# Altium footprint library 学习.PcbLib: 96 footprints (part 1 of 6)
Each footprint in its own frame and in the unit in brackets; x right, y up, seen from the top. Pads: shape width x height; smd on the part's side, far side on the other; paste and mask are expansions set on the pad; w line width, h text height; cw(c..) or ccw(c..) is an arc to the next point about the centre after c.
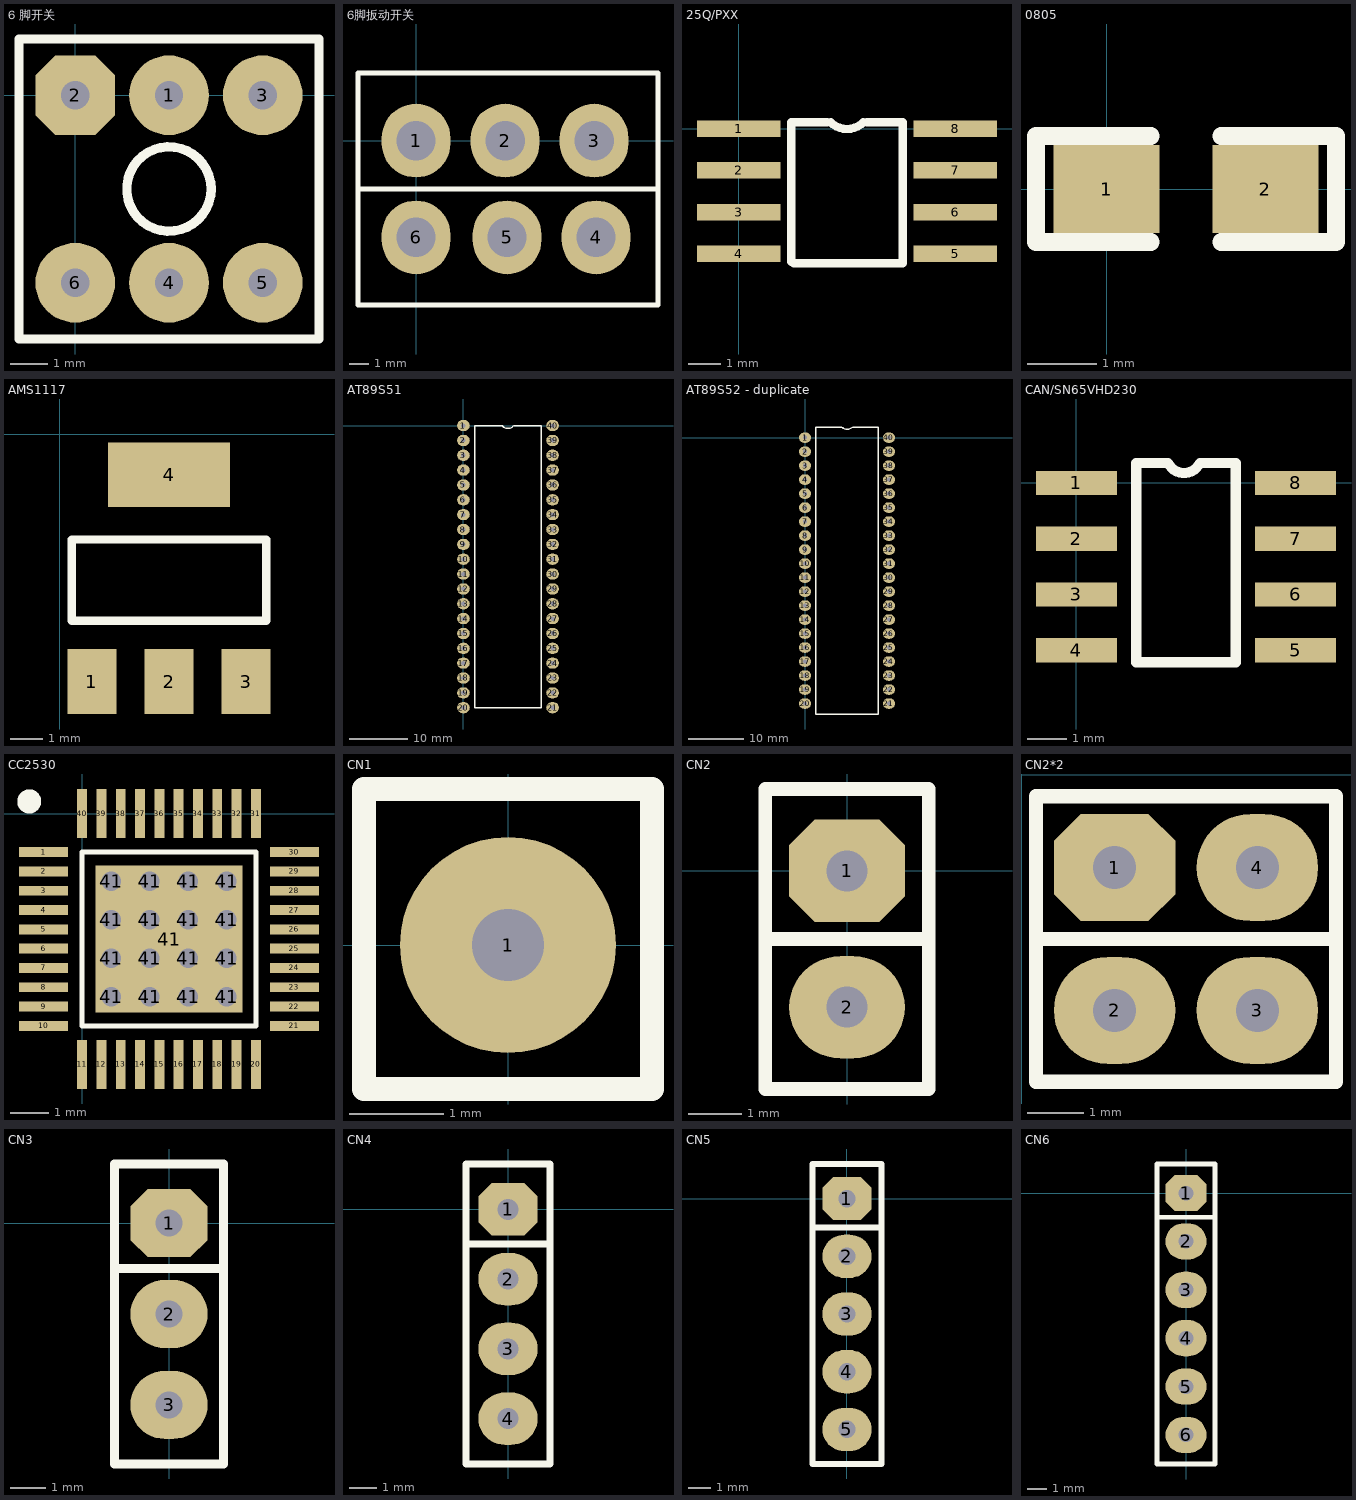
[diagram p0: the footprints below, top view; thin cyan lines are the x and y axes]

## 6 脚开关 [mil]
pads (6):
  round 85 hole 30 paste+0: 1(100,0) 3(200,0) 4(100,-200) 5(200,-200) 6(0,-200)
  oct 85x85 hole 30 paste+0: 2(0,0)
Top Overlay:
  circle w10: c100,-100 r45
  lines w10: -60,-260 -60,60 260,60 260,-260 -60,-260

## 6脚扳动开关 [mil]
pads (6):
  oval 140x150 hole 80: 1(0,0) 2(181.1,0) 3(362.2,0) 4(366.14,-196.85) 5(185.04,-196.85) 6(0,-196.85)
Top Overlay:
  lines w10: -118.11,-98.43 492.13,-98.43 ; -118.11,-334.65 492.13,-334.65 492.13,137.8 -118.11,137.8 -118.11,-334.65

## 25Q/PXX [mil]
pads (8):
  rect 100x20 smd: 1(0,0) 2(0,-50) 3(0,-100) 4(0,-150) 5(259.84,-150) 6(259.84,-100) 7(259.84,-50) 8(259.84,0)
Top Overlay:
  lines w10: 62.99,-159.45 62.99,7.87 ; 64.96,7.87 106.3,7.87 ; 65.94,-161.42 196.85,-161.42 ; 110.24,7.87 ccw(c129.92,27.56) 149.61,7.87 ; 153.54,7.87 196.85,7.87 196.85,-159.45

## 0805 [mil]
pads (2):
  rect 60x50 smd: 1(0,0) 2(90,0)
Top Overlay:
  lines w10: 25,-30 -40,-30 -40,30 25,30 ; 65,-30 130,-30 130,30 65,30

## AMS1117 [mil]
pads (4):
  rect 60x80 smd: 1(40,-305) 2(135,-305) 3(230,-305)
  rect 150x80 smd: 4(135,-50)
Top Overlay:
  lines w10: 15,-230 255,-230 255,-130 15,-130 15,-230

## AT89S51 [mil]
pads (40):
  oval 85x75 hole 30 paste+0: 1(0,0) 2(0,-100) 3(0,-200) 4(0,-300) 5(0,-400) 6(0,-500) 7(0,-600) 8(0,-700) 9(0,-800) 10(0,-900) 11(0,-1000) 12(0,-1100) 13(0,-1200) 14(0,-1300) 15(0,-1400) 16(0,-1500) 17(0,-1600) 18(0,-1700) 19(0,-1800) 20(0,-1900) 21(600,-1900) 22(600,-1800) 23(600,-1700) 24(600,-1600) 25(600,-1500) 26(600,-1400) 27(600,-1300) 28(600,-1200) 29(600,-1100) 30(600,-1000) 31(600,-900) 32(600,-800) 33(600,-700) 34(600,-600) 35(600,-500) 36(600,-400) 37(600,-300) 38(600,-200) 39(600,-100) 40(600,0)
Top Overlay:
  lines w10: 100,0 260,0 265,-5 ccw(c299.32,29.32) 333.64,-5 338.64,0 525,0 525,-1900 75,-1900 75,0 115,0

## AT89S52 - duplicate [mil]
pads (40):
  oval 85x75 hole 30: 1(0,0) 2(0,-100) 3(0,-200) 4(0,-300) 5(0,-400) 6(0,-500) 7(0,-600) 8(0,-700) 9(0,-800) 10(0,-900) 11(0,-1000) 12(0,-1100) 13(0,-1200) 14(0,-1300) 15(0,-1400) 16(0,-1500) 17(0,-1600) 18(0,-1700) 19(0,-1800) 20(0,-1900) 21(600,-1900) 22(600,-1800) 23(600,-1700) 24(600,-1600) 25(600,-1500) 26(600,-1400) 27(600,-1300) 28(600,-1200) 29(600,-1100) 30(600,-1000) 31(600,-900) 32(600,-800) 33(600,-700) 34(600,-600) 35(600,-500) 36(600,-400) 37(600,-300) 38(600,-200) 39(600,-100) 40(600,0)
Top Overlay:
  lines w10: 75,0 75,75 ; 75,0 75,75 ; 75,0 75,-1975 525,-1975 525,75 340,75 cw(c301.11,113.89) 262.22,75 75,75

## CAN/SN65VHD230 [mil]
pads (8):
  rect 80x24 smd: 1(0,0) 2(0,-55.12) 3(0,-110.24) 4(0,-165.35) 5(216.54,-165.35) 6(216.54,-110.24) 7(216.54,-55.12) 8(216.54,0)
Top Overlay:
  lines w10: 70.87,19.68 90.55,19.68 ccw(c106.3,27.56) 122.05,19.68 157.48,19.68 157.48,-177.17 59.06,-177.17 59.06,19.68 82.68,19.68

## CC2530 [mm]
pads (57):
  rect 1.27x0.254 smd: 1(-1,-1) 2(-1,-1.5) 3(-1,-2) 4(-1,-2.5) 5(-1,-3) 6(-1,-3.5) 7(-1,-4) 8(-1,-4.5) 9(-1,-5) 10(-1,-5.5) 21(5.5,-5.5) 22(5.5,-5) 23(5.5,-4.5) 24(5.5,-4) 25(5.5,-3.5) 26(5.5,-3) 27(5.5,-2.5) 28(5.5,-2) 29(5.5,-1.5) 30(5.5,-1)
  rect 0.254x1.27 smd: 11(0,-6.5) 12(0.5,-6.5) 13(1,-6.5) 14(1.5,-6.5) 15(2,-6.5) 16(2.5,-6.5) 17(3,-6.5) 18(3.5,-6.5) 19(4,-6.5) 20(4.5,-6.5) 31(4.5,0) 32(4,0) 33(3.5,0) 34(3,0) 35(2.5,0) 36(2,0) 37(1.5,0) 38(1,0) 39(0.5,0) 40(0,0)
  round 0.762 hole 0.508: 41(0.75,-4.75) 41(0.75,-3.75) 41(0.75,-2.75) 41(0.75,-1.75) 41(1.75,-4.75) 41(1.75,-3.75) 41(1.75,-2.75) 41(1.75,-1.75) 41(2.75,-4.75) 41(2.75,-3.75) 41(2.75,-2.75) 41(2.75,-1.75) 41(3.75,-4.75) 41(3.75,-3.75) 41(3.75,-2.75) 41(3.75,-1.75)
  rect 3.81x3.81 all layers, no hole: 41(2.25,-3.25)
Top Overlay:
  lines w0.127: -1.372,0.279 -1.372,0.381 ; 0,-5.5 4.5,-5.5 4.5,-1 0,-1 0,-5.5
  lines w0.254: -1.525,0.225 cw(c-1.368,0.317) -1.377,0.135 ; -1.241,0.18 cw(c-1.37,0.309) -1.194,0.356

## CN1 [mil]
pads (1):
  round 90 hole 30: 1(0,0)
Top Overlay:
  lines w10: -60,-60 -60,65 60,65 60,-60 -60,-60

## CN2 [mil]
pads (2):
  oct 85x75 hole 30 paste+0: 1(0,0)
  oval 85x75 hole 30 paste+0: 2(0,-100)
Top Overlay:
  lines w10: -60,-50 60,-50 ; -60,-160 -60,60 60,60 60,-160 -60,-160

## CN2*2 [mil]
pads (4):
  oct 85x75 hole 30 paste+0: 1(65,-65)
  oval 85x75 hole 30 paste+0: 2(65,-165) 3(165,-165) 4(165,-65)
Top Overlay:
  lines w10: 10,-115 220,-115 ; 10,-215 220,-215 220,-15 10,-15 10,-215

## CN3 [mil]
pads (3):
  oct 85x75 hole 30: 1(0,0)
  oval 85x75 hole 30: 2(0,-100) 3(0,-200)
Top Overlay:
  lines w10: -60,-50 60,-50 ; -60,-265 60,-265 60,65 -60,65 -60,-265

## CN4 [mil]
pads (4):
  oct 85x75 hole 30: 1(0,0)
  oval 85x75 hole 30: 2(0,-100) 3(0,-200) 4(0,-300)
Top Overlay:
  lines w10: -60,-50 60,-50 ; -60,-365 60,-365 60,65 -60,65 -60,-365

## CN5 [mil]
pads (5):
  oct 85x75 hole 30 paste+0: 1(0,0)
  oval 85x75 hole 30 paste+0: 2(0,-100) 3(0,-200) 4(0,-300) 5(0,-400)
Top Overlay:
  lines w10: -60,-50 60,-50 ; -60,-460 -60,60 60,60 60,-460 -60,-460

## CN6 [mil]
pads (6):
  oct 85x75 hole 30: 1(0,0)
  oval 85x75 hole 30: 2(0,-100) 3(0,-200) 4(0,-300) 5(0,-400) 6(0,-500)
Top Overlay:
  lines w10: -60,-50 60,-50 ; -60,-560 60,-560 60,60 -60,60 -60,-560